# Altium footprint library General.PCBLIB: 231 footprints (part 8 of 15)
Each footprint in its own frame and in the unit in brackets; x right, y up, seen from the top. Pads: shape width x height; smd on the part's side, far side on the other; paste and mask are expansions set on the pad; w line width, h text height; cw(c..) or ccw(c..) is an arc to the next point about the centre after c.
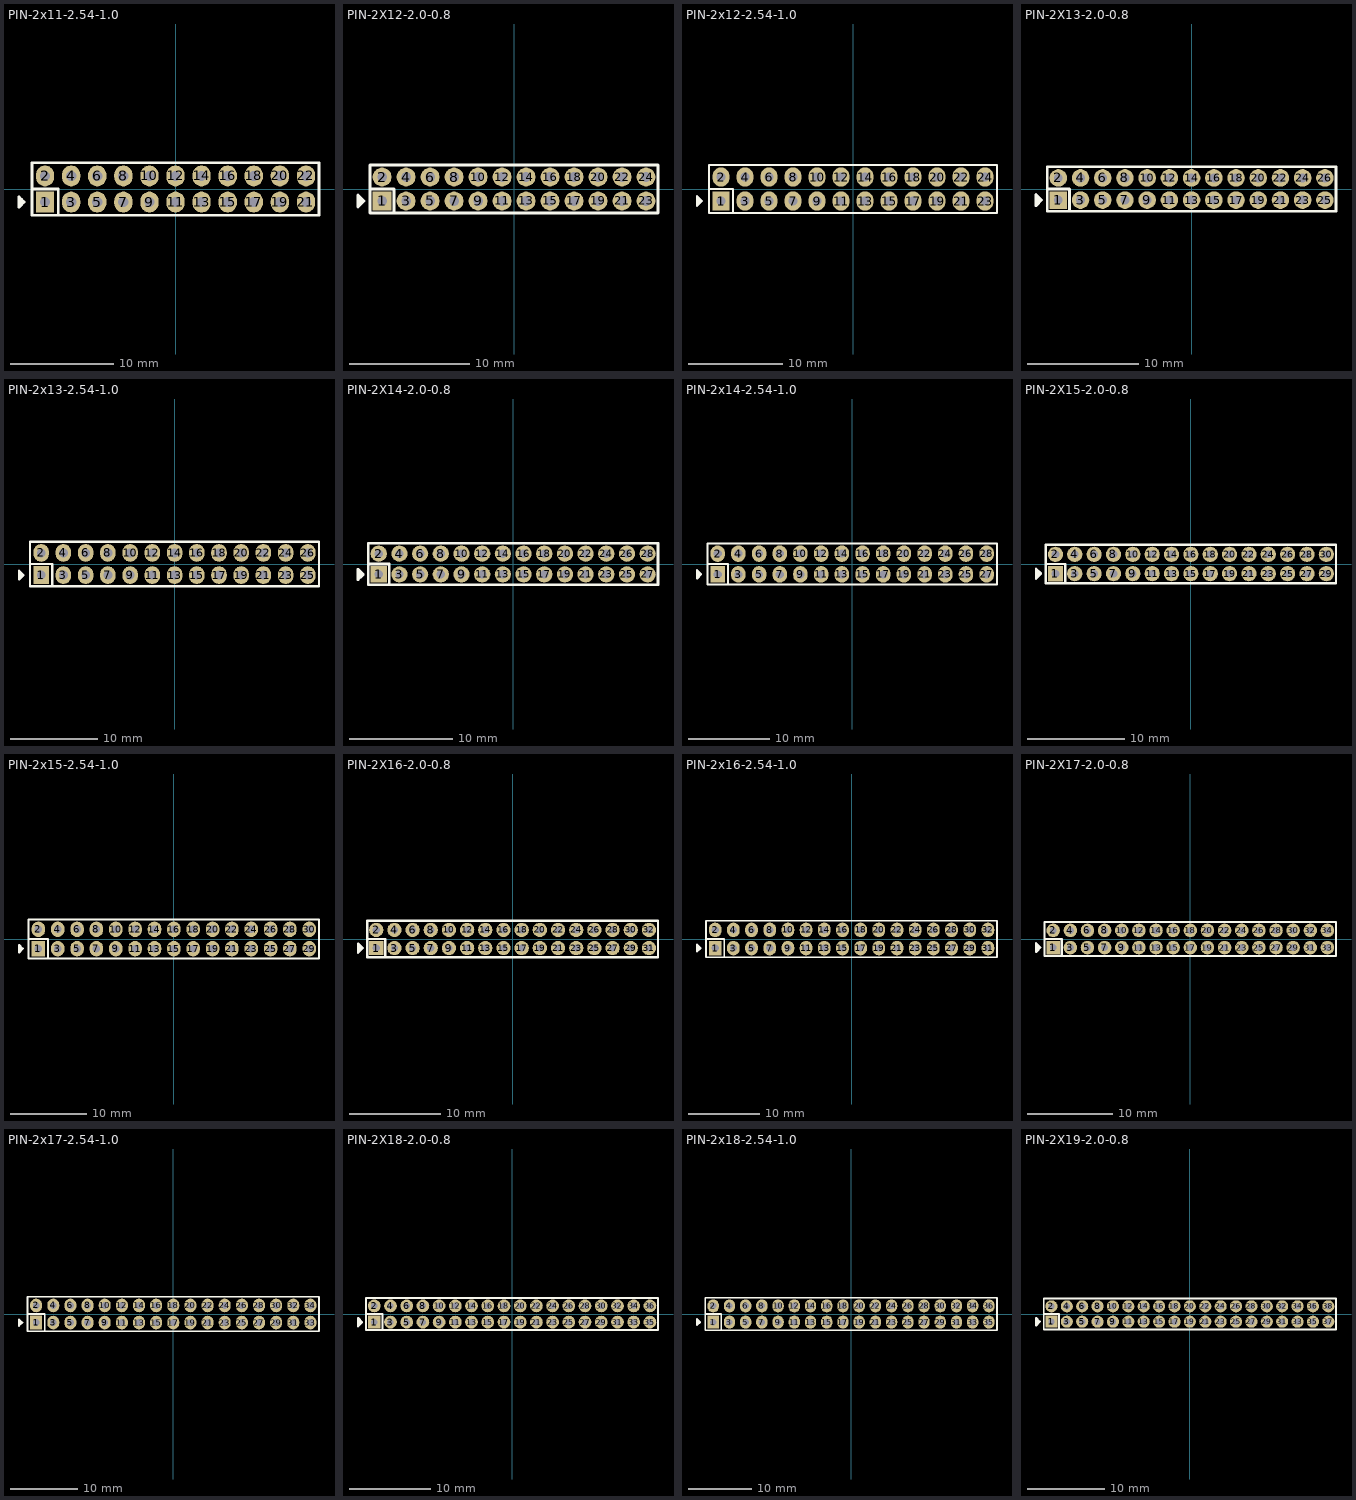
[diagram p7: the footprints below, top view; thin cyan lines are the x and y axes]

## PIN-2x11-2.54-1.0 [mil] "Pin Header"
height 374.02
pads (22):
  rect 70x80 hole 39.37: 1(-500,-50)
  oval 70x80 hole 39.37: 2(-500,50) 3(-400,-50) 4(-400,50) 5(-300,-50) 6(-300,50) 7(-200,-50) 8(-200,50) 9(-100,-50) 10(-100,50) 11(0,-50) 12(0,50) 13(100,-50) 14(100,50) 15(200,-50) 16(200,50) 17(300,-50) 18(300,50) 19(400,-50) 20(400,50) 21(500,-50) 22(500,50)
Top Overlay:
  lines w10: -590,-60 -590,-40 ; -550,0 -450,0 -450,-100 ; -600,-70 -600,-30 -580,-50 -600,-70 ; -550,-100 550,-100 550,100 -550,100 -550,-100
3D body "PIN2X11_100mils.STEP": height 397.64, standoff -59.06, extent -550,-100 550,100

## PIN-2X12-2.0-0.8 [mm] "Pin Header"
height 3.8
pads (24):
  rect 1.575x1.575 hole 0.8: 1(-11,-1)
  round 1.575 hole 0.8: 2(-11,1) 3(-9,-1) 4(-9,1) 5(-7,-1) 6(-7,1) 7(-5,-1) 8(-5,1) 9(-3,-1) 10(-3,1) 11(-1,-1) 12(-1,1) 13(1,-1) 14(1,1) 15(3,-1) 16(3,1) 17(5,-1) 18(5,1) 19(7,-1) 20(7,1) 21(9,-1) 22(9,1) 23(11,-1) 24(11,1)
Top Overlay:
  lines w0.254: -12.754,-1.254 -12.754,-0.746 ; -12,0 -10,0 -10,-2 ; -13.008,-1.508 -13.008,-0.492 -12.5,-1 -13.008,-1.508 ; -12,-2 12,-2 12,2 -12,2 -12,-2
3D body "Samtec-MTMM-112-02-G-D-150.STEP": height 5.31, standoff -1.17, extent -12,-2 11.988,1.998

## PIN-2x12-2.54-1.0 [mil] "Pin Header"
height 374.02
pads (24):
  rect 70x80 hole 39.37: 1(-550,-50)
  oval 70x80 hole 39.37: 2(-550,50) 3(-450,-50) 4(-450,50) 5(-350,-50) 6(-350,50) 7(-250,-50) 8(-250,50) 9(-150,-50) 10(-150,50) 11(-50,-50) 12(-50,50) 13(50,-50) 14(50,50) 15(150,-50) 16(150,50) 17(250,-50) 18(250,50) 19(350,-50) 20(350,50) 21(450,-50) 22(450,50) 23(550,-50) 24(550,50)
Top Overlay:
  lines w10: -640,-60 -640,-40 ; -600,0 -500,0 -500,-100 ; -650,-70 -650,-30 -630,-50 -650,-70 ; -600,-100 600,-100 600,100 -600,100 -600,-100
3D body "PIN2X12_100mils.STEP": height 397.64, standoff -59.06, extent -600,-100 600,100

## PIN-2X13-2.0-0.8 [mm] "Pin Header"
height 3.8
pads (26):
  rect 1.575x1.575 hole 0.8: 1(-12,-1)
  round 1.575 hole 0.8: 2(-12,1) 3(-10,-1) 4(-10,1) 5(-8,-1) 6(-8,1) 7(-6,-1) 8(-6,1) 9(-4,-1) 10(-4,1) 11(-2,-1) 12(-2,1) 13(0,-1) 14(0,1) 15(2,-1) 16(2,1) 17(4,-1) 18(4,1) 19(6,-1) 20(6,1) 21(8,-1) 22(8,1) 23(10,-1) 24(10,1) 25(12,-1) 26(12,1)
Top Overlay:
  lines w0.254: -13.754,-1.254 -13.754,-0.746 ; -13,0 -11,0 -11,-2 ; -14.008,-1.508 -14.008,-0.492 -13.5,-1 -14.008,-1.508 ; -13,-2 13,-2 13,2 -13,2 -13,-2
3D body "Samtec-MTMM-113-02-G-D-150.STEP": height 5.31, standoff -1.17, extent -13,-2 12.987,1.998

## PIN-2x13-2.54-1.0 [mil] "Pin Header"
height 374.02
pads (26):
  rect 70x80 hole 39.37: 1(-600,-50)
  oval 70x80 hole 39.37: 2(-600,50) 3(-500,-50) 4(-500,50) 5(-400,-50) 6(-400,50) 7(-300,-50) 8(-300,50) 9(-200,-50) 10(-200,50) 11(-100,-50) 12(-100,50) 13(0,-50) 14(0,50) 15(100,-50) 16(100,50) 17(200,-50) 18(200,50) 19(300,-50) 20(300,50) 21(400,-50) 22(400,50) 23(500,-50) 24(500,50) 25(600,-50) 26(600,50)
Top Overlay:
  lines w10: -690,-60 -690,-40 ; -650,0 -550,0 -550,-100 ; -700,-70 -680,-50 -700,-30 -700,-70 ; -650,-100 -650,100 650,100 650,-100 -650,-100
3D body "PIN2X13_100mils.STEP": height 397.64, standoff -59.06, extent -650,-100 650,100

## PIN-2X14-2.0-0.8 [mm] "Pin Header"
height 3.8
pads (28):
  rect 1.575x1.575 hole 0.8: 1(-13,-1)
  round 1.575 hole 0.8: 2(-13,1) 3(-11,-1) 4(-11,1) 5(-9,-1) 6(-9,1) 7(-7,-1) 8(-7,1) 9(-5,-1) 10(-5,1) 11(-3,-1) 12(-3,1) 13(-1,-1) 14(-1,1) 15(1,-1) 16(1,1) 17(3,-1) 18(3,1) 19(5,-1) 20(5,1) 21(7,-1) 22(7,1) 23(9,-1) 24(9,1) 25(11,-1) 26(11,1) 27(13,-1) 28(13,1)
Top Overlay:
  lines w0.254: -14.754,-1.254 -14.754,-0.746 ; -14,0 -12,0 -12,-2 ; -15.008,-1.508 -14.5,-1 -15.008,-0.492 -15.008,-1.508 ; -14,-2 -14,2 14,2 14,-2 -14,-2
3D body "Samtec-MTMM-114-02-G-D-150.STEP": height 5.31, standoff -1.17, extent -14,-2 13.986,1.998

## PIN-2x14-2.54-1.0 [mil] "Pin Header"
height 374.02
pads (28):
  rect 70x80 hole 39.37: 1(-650,-50)
  oval 70x80 hole 39.37: 2(-650,50) 3(-550,-50) 4(-550,50) 5(-450,-50) 6(-450,50) 7(-350,-50) 8(-350,50) 9(-250,-50) 10(-250,50) 11(-150,-50) 12(-150,50) 13(-50,-50) 14(-50,50) 15(50,-50) 16(50,50) 17(150,-50) 18(150,50) 19(250,-50) 20(250,50) 21(350,-50) 22(350,50) 23(450,-50) 24(450,50) 25(550,-50) 26(550,50) 27(650,-50) 28(650,50)
Top Overlay:
  lines w10: -740,-60 -740,-40 ; -700,0 -600,0 -600,-100 ; -750,-70 -730,-50 -750,-30 -750,-70 ; -700,-100 -700,100 700,100 700,-100 -700,-100
3D body "PIN2X14_100mils.STEP": height 397.64, standoff -59.06, extent -700,-100 700,100

## PIN-2X15-2.0-0.8 [mm] "Pin Header"
height 3.8
pads (30):
  rect 1.575x1.575 hole 0.8: 1(-14,-1)
  round 1.575 hole 0.8: 2(-14,1) 3(-12,-1) 4(-12,1) 5(-10,-1) 6(-10,1) 7(-8,-1) 8(-8,1) 9(-6,-1) 10(-6,1) 11(-4,-1) 12(-4,1) 13(-2,-1) 14(-2,1) 15(0,-1) 16(0,1) 17(2,-1) 18(2,1) 19(4,-1) 20(4,1) 21(6,-1) 22(6,1) 23(8,-1) 24(8,1) 25(10,-1) 26(10,1) 27(12,-1) 28(12,1) 29(14,-1) 30(14,1)
Top Overlay:
  lines w0.254: -15.754,-1.254 -15.754,-0.746 ; -15,0 -13,0 -13,-2 ; -16.008,-1.508 -16.008,-0.492 -15.5,-1 -16.008,-1.508 ; -15,-2 15,-2 15,2 -15,2 -15,-2
3D body "Samtec-MTMM-115-02-G-D-150.STEP": height 5.31, standoff -1.17, extent -15,-2 14.985,1.998

## PIN-2x15-2.54-1.0 [mil] "Pin Header"
height 374.02
pads (30):
  rect 70x80 hole 39.37: 1(-700,-50)
  oval 70x80 hole 39.37: 2(-700,50) 3(-600,-50) 4(-600,50) 5(-500,-50) 6(-500,50) 7(-400,-50) 8(-400,50) 9(-300,-50) 10(-300,50) 11(-200,-50) 12(-200,50) 13(-100,-50) 14(-100,50) 15(0,-50) 16(0,50) 17(100,-50) 18(100,50) 19(200,-50) 20(200,50) 21(300,-50) 22(300,50) 23(400,-50) 24(400,50) 25(500,-50) 26(500,50) 27(600,-50) 28(600,50) 29(700,-50) 30(700,50)
Top Overlay:
  lines w10: -790,-60 -790,-40 ; -750,0 -650,0 -650,-100 ; -800,-70 -800,-30 -780,-50 -800,-70 ; -750,-100 750,-100 750,100 -750,100 -750,-100
3D body "PIN2X15_100mils.STEP": height 397.64, standoff -59.06, extent -750,-100 750,100

## PIN-2X16-2.0-0.8 [mm] "Pin Header"
height 3.8
pads (32):
  rect 1.575x1.575 hole 0.8: 1(-15,-1)
  round 1.575 hole 0.8: 2(-15,1) 3(-13,-1) 4(-13,1) 5(-11,-1) 6(-11,1) 7(-9,-1) 8(-9,1) 9(-7,-1) 10(-7,1) 11(-5,-1) 12(-5,1) 13(-3,-1) 14(-3,1) 15(-1,-1) 16(-1,1) 17(1,-1) 18(1,1) 19(3,-1) 20(3,1) 21(5,-1) 22(5,1) 23(7,-1) 24(7,1) 25(9,-1) 26(9,1) 27(11,-1) 28(11,1) 29(13,-1) 30(13,1) 31(15,-1) 32(15,1)
Top Overlay:
  lines w0.254: -16.754,-1.254 -16.754,-0.746 ; -16,0 -14,0 -14,-2 ; -17.008,-1.508 -17.008,-0.492 -16.5,-1 -17.008,-1.508 ; -16,-2 16,-2 16,2 -16,2 -16,-2
3D body "Samtec-MTMM-116-02-G-D-150.STEP": height 5.31, standoff -1.17, extent -16,-2 15.984,1.998

## PIN-2x16-2.54-1.0 [mil] "Pin Header"
height 374.02
pads (32):
  rect 70x80 hole 39.37: 1(-750,-50)
  oval 70x80 hole 39.37: 2(-750,50) 3(-650,-50) 4(-650,50) 5(-550,-50) 6(-550,50) 7(-450,-50) 8(-450,50) 9(-350,-50) 10(-350,50) 11(-250,-50) 12(-250,50) 13(-150,-50) 14(-150,50) 15(-50,-50) 16(-50,50) 17(50,-50) 18(50,50) 19(150,-50) 20(150,50) 21(250,-50) 22(250,50) 23(350,-50) 24(350,50) 25(450,-50) 26(450,50) 27(550,-50) 28(550,50) 29(650,-50) 30(650,50) 31(750,-50) 32(750,50)
Top Overlay:
  lines w10: -840,-60 -840,-40 ; -800,0 -700,0 -700,-100 ; -850,-70 -830,-50 -850,-30 -850,-70 ; -800,-100 -800,100 800,100 800,-100 -800,-100
3D body "PIN2X16_100mils.STEP": height 397.64, standoff -59.06, extent -800,-100 800,100

## PIN-2X17-2.0-0.8 [mm] "Pin Header"
height 3.8
pads (34):
  rect 1.575x1.575 hole 0.8: 1(-16,-1)
  round 1.575 hole 0.8: 2(-16,1) 3(-14,-1) 4(-14,1) 5(-12,-1) 6(-12,1) 7(-10,-1) 8(-10,1) 9(-8,-1) 10(-8,1) 11(-6,-1) 12(-6,1) 13(-4,-1) 14(-4,1) 15(-2,-1) 16(-2,1) 17(0,-1) 18(0,1) 19(2,-1) 20(2,1) 21(4,-1) 22(4,1) 23(6,-1) 24(6,1) 25(8,-1) 26(8,1) 27(10,-1) 28(10,1) 29(12,-1) 30(12,1) 31(14,-1) 32(14,1) 33(16,-1) 34(16,1)
Top Overlay:
  lines w0.254: -17.754,-1.254 -17.754,-0.746 ; -17,0 -15,0 -15,-2 ; -18.008,-1.508 -18.008,-0.492 -17.5,-1 -18.008,-1.508 ; -17,-2 17,-2 17,2 -17,2 -17,-2
3D body "Samtec-MTMM-117-02-G-D-150.STEP": height 5.31, standoff -1.17, extent -17,-2 16.983,1.998

## PIN-2x17-2.54-1.0 [mil] "Pin Header"
height 374.02
pads (34):
  rect 70x80 hole 39.37: 1(-800,-50)
  oval 70x80 hole 39.37: 2(-800,50) 3(-700,-50) 4(-700,50) 5(-600,-50) 6(-600,50) 7(-500,-50) 8(-500,50) 9(-400,-50) 10(-400,50) 11(-300,-50) 12(-300,50) 13(-200,-50) 14(-200,50) 15(-100,-50) 16(-100,50) 17(0,-50) 18(0,50) 19(100,-50) 20(100,50) 21(200,-50) 22(200,50) 23(300,-50) 24(300,50) 25(400,-50) 26(400,50) 27(500,-50) 28(500,50) 29(600,-50) 30(600,50) 31(700,-50) 32(700,50) 33(800,-50) 34(800,50)
Top Overlay:
  lines w10: -890,-60 -890,-40 ; -850,0 -750,0 -750,-100 ; -900,-70 -900,-30 -880,-50 -900,-70 ; -850,-100 850,-100 850,100 -850,100 -850,-100
3D body "PIN2X17_100mils.STEP": height 397.64, standoff -59.06, extent -850,-100 850,100

## PIN-2X18-2.0-0.8 [mm] "Pin Header"
height 3.8
pads (36):
  rect 1.575x1.575 hole 0.8: 1(-17,-1)
  round 1.575 hole 0.8: 2(-17,1) 3(-15,-1) 4(-15,1) 5(-13,-1) 6(-13,1) 7(-11,-1) 8(-11,1) 9(-9,-1) 10(-9,1) 11(-7,-1) 12(-7,1) 13(-5,-1) 14(-5,1) 15(-3,-1) 16(-3,1) 17(-1,-1) 18(-1,1) 19(1,-1) 20(1,1) 21(3,-1) 22(3,1) 23(5,-1) 24(5,1) 25(7,-1) 26(7,1) 27(9,-1) 28(9,1) 29(11,-1) 30(11,1) 31(13,-1) 32(13,1) 33(15,-1) 34(15,1) 35(17,-1) 36(17,1)
Top Overlay:
  lines w0.254: -18.754,-1.254 -18.754,-0.746 ; -18,0 -16,0 -16,-2 ; -19.008,-1.508 -18.5,-1 -19.008,-0.492 -19.008,-1.508 ; -18,-2 -18,2 18,2 18,-2 -18,-2
3D body "Samtec-MTMM-118-02-G-D-150.STEP": height 5.31, standoff -1.17, extent -18,-2 17.982,1.998

## PIN-2x18-2.54-1.0 [mil] "Pin Header"
height 374.02
pads (36):
  rect 70x80 hole 39.37: 1(-850,-50)
  oval 70x80 hole 39.37: 2(-850,50) 3(-750,-50) 4(-750,50) 5(-650,-50) 6(-650,50) 7(-550,-50) 8(-550,50) 9(-450,-50) 10(-450,50) 11(-350,-50) 12(-350,50) 13(-250,-50) 14(-250,50) 15(-150,-50) 16(-150,50) 17(-50,-50) 18(-50,50) 19(50,-50) 20(50,50) 21(150,-50) 22(150,50) 23(250,-50) 24(250,50) 25(350,-50) 26(350,50) 27(450,-50) 28(450,50) 29(550,-50) 30(550,50) 31(650,-50) 32(650,50) 33(750,-50) 34(750,50) 35(850,-50) 36(850,50)
Top Overlay:
  lines w10: -940,-60 -940,-40 ; -900,0 -800,0 -800,-100 ; -950,-70 -950,-30 -930,-50 -950,-70 ; -900,-100 900,-100 900,100 -900,100 -900,-100
3D body "PIN2X18_100mils.STEP": height 397.64, standoff -59.06, extent -900,-100 900,100

## PIN-2X19-2.0-0.8 [mm] "Pin Header"
height 3.8
pads (38):
  rect 1.575x1.575 hole 0.8: 1(-18,-1)
  round 1.575 hole 0.8: 2(-18,1) 3(-16,-1) 4(-16,1) 5(-14,-1) 6(-14,1) 7(-12,-1) 8(-12,1) 9(-10,-1) 10(-10,1) 11(-8,-1) 12(-8,1) 13(-6,-1) 14(-6,1) 15(-4,-1) 16(-4,1) 17(-2,-1) 18(-2,1) 19(0,-1) 20(0,1) 21(2,-1) 22(2,1) 23(4,-1) 24(4,1) 25(6,-1) 26(6,1) 27(8,-1) 28(8,1) 29(10,-1) 30(10,1) 31(12,-1) 32(12,1) 33(14,-1) 34(14,1) 35(16,-1) 36(16,1) 37(18,-1) 38(18,1)
Top Overlay:
  lines w0.254: -19.754,-1.254 -19.754,-0.746 ; -19,0 -17,0 -17,-2 ; -20.008,-1.508 -20.008,-0.492 -19.5,-1 -20.008,-1.508 ; -19,-2 19,-2 19,2 -19,2 -19,-2
3D body "Samtec-MTMM-119-02-G-D-150.STEP": height 5.31, standoff -1.17, extent -19,-2 18.981,1.998